# Altium schematic symbol library jlcpcb_2025_04_inductors_extended_0805.schlib: 882 symbols (part 2 of 5)
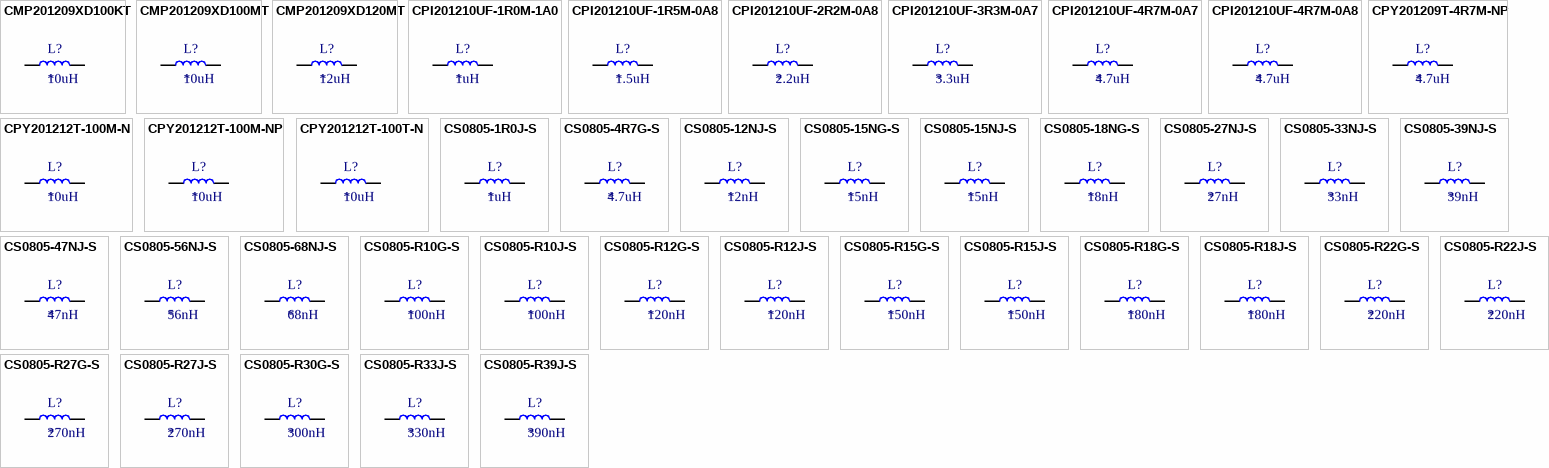
[diagram p23: symbols CMP201209XD100KT to CS0805-R39J-S]

## CS0805-R12G-S
designator L?  Inductance: 120nH
Inductor, 120nH, ±2%, 510mΩ, 400mA, SMD 0805; Manufacturer: Chilisin Elec; Manufacturer Part Number: CS0805-R12G-S; Self-Resonant Frequency: 250MHz; Q Factor: 50@150MHz; Package Size: 0805; JLCPCB Basic Part: No; JLCPCB Part Number: C320429; Supplier 1: LCSC; Category: Inductors; Supplier Part Number 1: C320429; Tolerance: ±2%; Rated Current: 400mA; DC Resistance: 510mΩ; RoHS: Yes; ComponentLink1Description: Datasheet; ComponentLink1URL: https://wmsc.lcsc.com/wmsc/upload/file/pdf/v2/lcsc/2304140030_Chilisin-Elec-CS0805-R12G-S_C320429.pdf; ComponentLink2Description: JLCPCB Part URL; ComponentLink2URL: https://jlcpcb.com/partdetail/C320429; ComponentLink3Description: LCSC Part URL; ComponentLink3URL: https://lcsc.com/product-detail/Inductors-SMD_Chilisin-Elec-Chilisin-Elec-CS0805-R12G-S_C320429.html
footprint IND-0805 (0805 (2012M) Inductor)
pins: 1, 2

## CS0805-R12J-S
designator L?  Inductance: 120nH
Inductor, 120nH, ±5%, 510mΩ, 400mA, SMD 0805; Manufacturer: Chilisin Elec; Manufacturer Part Number: CS0805-R12J-S; Self-Resonant Frequency: 250MHz; Q Factor: 50@150MHz; Package Size: 0805; JLCPCB Basic Part: No; JLCPCB Part Number: C108268; Supplier 1: LCSC; Category: Inductors; Supplier Part Number 1: C108268; Tolerance: ±5%; Rated Current: 400mA; DC Resistance: 510mΩ; RoHS: Yes; ComponentLink1Description: Datasheet; ComponentLink1URL: https://wmsc.lcsc.com/wmsc/upload/file/pdf/v2/lcsc/2304140030_Chilisin-Elec-CS0805-R12J-S_C108268.pdf; ComponentLink2Description: JLCPCB Part URL; ComponentLink2URL: https://jlcpcb.com/partdetail/C108268; ComponentLink3Description: LCSC Part URL; ComponentLink3URL: https://lcsc.com/product-detail/Inductors-SMD_Chilisin-Elec-Chilisin-Elec-CS0805-R12J-S_C108268.html
footprint IND-0805 (0805 (2012M) Inductor)
pins: 1, 2

## CS0805-R15G-S
designator L?  Inductance: 150nH
Inductor, 150nH, ±2%, 560mΩ, 400mA, SMD 0805; Manufacturer: Chilisin Elec; Manufacturer Part Number: CS0805-R15G-S; Self-Resonant Frequency: 250MHz; Q Factor: 50@100MHz; Package Size: 0805; JLCPCB Basic Part: No; JLCPCB Part Number: C285947; Supplier 1: LCSC; Category: Inductors; Supplier Part Number 1: C285947; Tolerance: ±2%; Rated Current: 400mA; DC Resistance: 560mΩ; RoHS: Yes; ComponentLink1Description: Datasheet; ComponentLink1URL: https://wmsc.lcsc.com/wmsc/upload/file/pdf/v2/lcsc/2304140030_Chilisin-Elec-CS0805-R15G-S_C285947.pdf; ComponentLink2Description: JLCPCB Part URL; ComponentLink2URL: https://jlcpcb.com/partdetail/C285947; ComponentLink3Description: LCSC Part URL; ComponentLink3URL: https://lcsc.com/product-detail/Inductors-SMD_Chilisin-Elec-Chilisin-Elec-CS0805-R15G-S_C285947.html
footprint IND-0805 (0805 (2012M) Inductor)
pins: 1, 2

## CS0805-R15J-S
designator L?  Inductance: 150nH
Inductor, 150nH, ±5%, 560mΩ, 400mA, SMD 0805; Manufacturer: Chilisin Elec; Manufacturer Part Number: CS0805-R15J-S; Self-Resonant Frequency: 250MHz; Q Factor: 50@100MHz; Package Size: 0805; JLCPCB Basic Part: No; JLCPCB Part Number: C280464; Supplier 1: LCSC; Category: Inductors; Supplier Part Number 1: C280464; Tolerance: ±5%; Rated Current: 400mA; DC Resistance: 560mΩ; RoHS: Yes; ComponentLink1Description: Datasheet; ComponentLink1URL: https://wmsc.lcsc.com/wmsc/upload/file/pdf/v2/lcsc/2304140030_Chilisin-Elec-CS0805-R15J-S_C280464.pdf; ComponentLink2Description: JLCPCB Part URL; ComponentLink2URL: https://jlcpcb.com/partdetail/C280464; ComponentLink3Description: LCSC Part URL; ComponentLink3URL: https://lcsc.com/product-detail/Inductors-SMD_Chilisin-Elec-Chilisin-Elec-CS0805-R15J-S_C280464.html
footprint IND-0805 (0805 (2012M) Inductor)
pins: 1, 2

## CS0805-R18G-S
designator L?  Inductance: 180nH
Inductor, 180nH, ±2%, 640mΩ, 400mA, SMD 0805; Manufacturer: Chilisin Elec; Manufacturer Part Number: CS0805-R18G-S; Self-Resonant Frequency: 250MHz; Q Factor: 50@100MHz; Package Size: 0805; JLCPCB Basic Part: No; JLCPCB Part Number: C285946; Supplier 1: LCSC; Category: Inductors; Supplier Part Number 1: C285946; Tolerance: ±2%; Rated Current: 400mA; DC Resistance: 640mΩ; RoHS: Yes; ComponentLink1Description: Datasheet; ComponentLink1URL: https://wmsc.lcsc.com/wmsc/upload/file/pdf/v2/lcsc/1912111437_Chilisin-Elec-CS0805-R18G-S_C285946.pdf; ComponentLink2Description: JLCPCB Part URL; ComponentLink2URL: https://jlcpcb.com/partdetail/C285946; ComponentLink3Description: LCSC Part URL; ComponentLink3URL: https://lcsc.com/product-detail/Inductors-SMD_Chilisin-Elec-Chilisin-Elec-CS0805-R18G-S_C285946.html
footprint IND-0805 (0805 (2012M) Inductor)
pins: 1, 2

## CS0805-R18J-S
designator L?  Inductance: 180nH
Inductor, 180nH, ±5%, 640mΩ, 400mA, SMD 0805; Manufacturer: Chilisin Elec; Manufacturer Part Number: CS0805-R18J-S; Self-Resonant Frequency: 250MHz; Q Factor: 50@100MHz; Package Size: 0805; JLCPCB Basic Part: No; JLCPCB Part Number: C108269; Supplier 1: LCSC; Category: Inductors; Supplier Part Number 1: C108269; Tolerance: ±5%; Rated Current: 400mA; DC Resistance: 640mΩ; RoHS: Yes; ComponentLink1Description: Datasheet; ComponentLink1URL: https://wmsc.lcsc.com/wmsc/upload/file/pdf/v2/lcsc/2304140030_Chilisin-Elec-CS0805-R18J-S_C108269.pdf; ComponentLink2Description: JLCPCB Part URL; ComponentLink2URL: https://jlcpcb.com/partdetail/C108269; ComponentLink3Description: LCSC Part URL; ComponentLink3URL: https://lcsc.com/product-detail/Inductors-SMD_Chilisin-Elec-Chilisin-Elec-CS0805-R18J-S_C108269.html
footprint IND-0805 (0805 (2012M) Inductor)
pins: 1, 2

## CS0805-R22G-S
designator L?  Inductance: 220nH
Inductor, 220nH, ±2%, 70mΩ, 400mA, SMD 0805; Manufacturer: Chilisin Elec; Manufacturer Part Number: CS0805-R22G-S; Self-Resonant Frequency: 100MHz; Q Factor: 50@100MHz; Package Size: 0805; JLCPCB Basic Part: No; JLCPCB Part Number: C2847108; Supplier 1: LCSC; Category: Inductors; Supplier Part Number 1: C2847108; Tolerance: ±2%; Rated Current: 400mA; DC Resistance: 70mΩ; RoHS: Yes; ComponentLink1Description: Datasheet; ComponentLink1URL: https://wmsc.lcsc.com/wmsc/upload/file/pdf/v2/lcsc/2108142130_Chilisin-Elec-CS0805-R22G-S_C2847108.pdf; ComponentLink2Description: JLCPCB Part URL; ComponentLink2URL: https://jlcpcb.com/partdetail/C2847108; ComponentLink3Description: LCSC Part URL; ComponentLink3URL: https://lcsc.com/product-detail/Inductors-SMD_Chilisin-Elec-Chilisin-Elec-CS0805-R22G-S_C2847108.html
footprint IND-0805 (0805 (2012M) Inductor)
pins: 1, 2

## CS0805-R22J-S
designator L?  Inductance: 220nH
Inductor, 220nH, ±5%, 700mΩ, 400mA, SMD 0805; Manufacturer: Chilisin Elec; Manufacturer Part Number: CS0805-R22J-S; Self-Resonant Frequency: 250MHz; Q Factor: 50@100MHz; Package Size: 0805; JLCPCB Basic Part: No; JLCPCB Part Number: C108270; Supplier 1: LCSC; Category: Inductors; Supplier Part Number 1: C108270; Tolerance: ±5%; Rated Current: 400mA; DC Resistance: 700mΩ; RoHS: Yes; ComponentLink1Description: Datasheet; ComponentLink1URL: https://wmsc.lcsc.com/wmsc/upload/file/pdf/v2/lcsc/2304140030_Chilisin-Elec-CS0805-R22J-S_C108270.pdf; ComponentLink2Description: JLCPCB Part URL; ComponentLink2URL: https://jlcpcb.com/partdetail/C108270; ComponentLink3Description: LCSC Part URL; ComponentLink3URL: https://lcsc.com/product-detail/Inductors-SMD_Chilisin-Elec-Chilisin-Elec-CS0805-R22J-S_C108270.html
footprint IND-0805 (0805 (2012M) Inductor)
pins: 1, 2

## CS0805-R27G-S
designator L?  Inductance: 270nH
Inductor, 270nH, ±2%, 1Ω, 350mA, SMD 0805; Manufacturer: Chilisin Elec; Manufacturer Part Number: CS0805-R27G-S; Self-Resonant Frequency: 250MHz; Q Factor: 48@100MHz; Package Size: 0805; JLCPCB Basic Part: No; JLCPCB Part Number: C285945; Supplier 1: LCSC; Category: Inductors; Supplier Part Number 1: C285945; Tolerance: ±2%; Rated Current: 350mA; DC Resistance: 1Ω; RoHS: Yes; ComponentLink1Description: Datasheet; ComponentLink1URL: https://wmsc.lcsc.com/wmsc/upload/file/pdf/v2/lcsc/2304140030_Chilisin-Elec-CS0805-R27G-S_C285945.pdf; ComponentLink2Description: JLCPCB Part URL; ComponentLink2URL: https://jlcpcb.com/partdetail/C285945; ComponentLink3Description: LCSC Part URL; ComponentLink3URL: https://lcsc.com/product-detail/Inductors-SMD_Chilisin-Elec-Chilisin-Elec-CS0805-R27G-S_C285945.html
footprint IND-0805 (0805 (2012M) Inductor)
pins: 1, 2

## CS0805-R27J-S
designator L?  Inductance: 270nH
Inductor, 270nH, ±5%, 1Ω, 350mA, SMD 0805; Manufacturer: Chilisin Elec; Manufacturer Part Number: CS0805-R27J-S; Self-Resonant Frequency: 250MHz; Q Factor: 48@100MHz; Package Size: 0805; JLCPCB Basic Part: No; JLCPCB Part Number: C108271; Supplier 1: LCSC; Category: Inductors; Supplier Part Number 1: C108271; Tolerance: ±5%; Rated Current: 350mA; DC Resistance: 1Ω; RoHS: Yes; ComponentLink1Description: Datasheet; ComponentLink1URL: https://wmsc.lcsc.com/wmsc/upload/file/pdf/v2/lcsc/2304140030_Chilisin-Elec-CS0805-R27J-S_C108271.pdf; ComponentLink2Description: JLCPCB Part URL; ComponentLink2URL: https://jlcpcb.com/partdetail/C108271; ComponentLink3Description: LCSC Part URL; ComponentLink3URL: https://lcsc.com/product-detail/Inductors-SMD_Chilisin-Elec-Chilisin-Elec-CS0805-R27J-S_C108271.html
footprint IND-0805 (0805 (2012M) Inductor)
pins: 1, 2

## CS0805-R30G-S
designator L?  Inductance: 300nH
Inductor, 300nH, ±2%, 1.4Ω, 310mA, SMD 0805; Manufacturer: Chilisin Elec; Manufacturer Part Number: CS0805-R30G-S; Self-Resonant Frequency: 250MHz; Q Factor: 25@100MHz; Package Size: 0805; JLCPCB Basic Part: No; JLCPCB Part Number: C320430; Supplier 1: LCSC; Category: Inductors; Supplier Part Number 1: C320430; Tolerance: ±2%; Rated Current: 310mA; DC Resistance: 1.4Ω; RoHS: Yes; ComponentLink1Description: Datasheet; ComponentLink1URL: https://wmsc.lcsc.com/wmsc/upload/file/pdf/v2/lcsc/2304140030_Chilisin-Elec-CS0805-R30G-S_C320430.pdf; ComponentLink2Description: JLCPCB Part URL; ComponentLink2URL: https://jlcpcb.com/partdetail/C320430; ComponentLink3Description: LCSC Part URL; ComponentLink3URL: https://lcsc.com/product-detail/Inductors-SMD_Chilisin-Elec-Chilisin-Elec-CS0805-R30G-S_C320430.html
footprint IND-0805 (0805 (2012M) Inductor)
pins: 1, 2

## CS0805-R33J-S
designator L?  Inductance: 330nH
Inductor, 330nH, ±5%, 1.4Ω, 310mA, SMD 0805; Manufacturer: Chilisin Elec; Manufacturer Part Number: CS0805-R33J-S; Self-Resonant Frequency: 250MHz; Q Factor: 48@100MHz; Package Size: 0805; JLCPCB Basic Part: No; JLCPCB Part Number: C285944; Supplier 1: LCSC; Category: Inductors; Supplier Part Number 1: C285944; Tolerance: ±5%; Rated Current: 310mA; DC Resistance: 1.4Ω; RoHS: Yes; ComponentLink1Description: Datasheet; ComponentLink1URL: https://wmsc.lcsc.com/wmsc/upload/file/pdf/v2/lcsc/2304140030_Chilisin-Elec-CS0805-R33J-S_C285944.pdf; ComponentLink2Description: JLCPCB Part URL; ComponentLink2URL: https://jlcpcb.com/partdetail/C285944; ComponentLink3Description: LCSC Part URL; ComponentLink3URL: https://lcsc.com/product-detail/Inductors-SMD_Chilisin-Elec-Chilisin-Elec-CS0805-R33J-S_C285944.html
footprint IND-0805 (0805 (2012M) Inductor)
pins: 1, 2

## CS0805-R39J-S
designator L?  Inductance: 390nH
Inductor, 390nH, ±5%, 1.5Ω, 290mA, SMD 0805; Manufacturer: Chilisin Elec; Manufacturer Part Number: CS0805-R39J-S; Self-Resonant Frequency: 250MHz; Q Factor: 48@100MHz; Package Size: 0805; JLCPCB Basic Part: No; JLCPCB Part Number: C108272; Supplier 1: LCSC; Category: Inductors; Supplier Part Number 1: C108272; Tolerance: ±5%; Rated Current: 290mA; DC Resistance: 1.5Ω; RoHS: Yes; ComponentLink1Description: Datasheet; ComponentLink1URL: https://wmsc.lcsc.com/wmsc/upload/file/pdf/v2/lcsc/2304140030_Chilisin-Elec-CS0805-R39J-S_C108272.pdf; ComponentLink2Description: JLCPCB Part URL; ComponentLink2URL: https://jlcpcb.com/partdetail/C108272; ComponentLink3Description: LCSC Part URL; ComponentLink3URL: https://lcsc.com/product-detail/Inductors-SMD_Chilisin-Elec-Chilisin-Elec-CS0805-R39J-S_C108272.html
footprint IND-0805 (0805 (2012M) Inductor)
pins: 1, 2

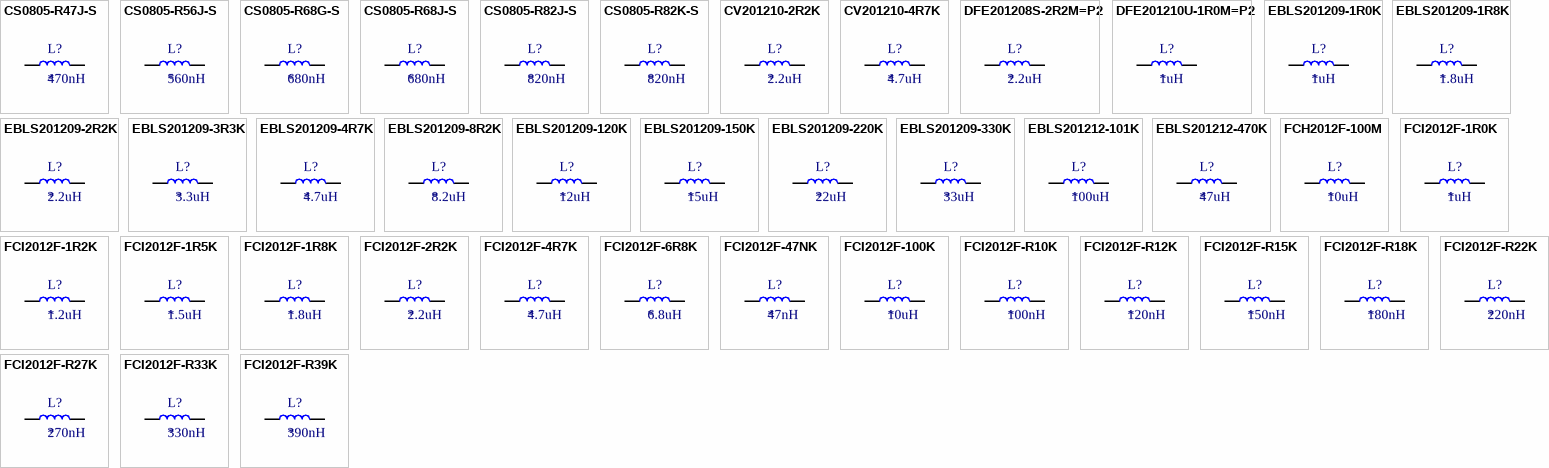
[diagram p5: symbols CS0805-R47J-S to FCI2012F-R39K]

## CS0805-R47J-S
designator L?  Inductance: 470nH
Inductor, 470nH, ±5%, 1.76Ω, 250mA, SMD 0805; Manufacturer: Chilisin Elec; Manufacturer Part Number: CS0805-R47J-S; Self-Resonant Frequency: 100MHz; Q Factor: 33@50MHz; Package Size: 0805; JLCPCB Basic Part: No; JLCPCB Part Number: C108273; Supplier 1: LCSC; Category: Inductors; Supplier Part Number 1: C108273; Tolerance: ±5%; Rated Current: 250mA; DC Resistance: 1.76Ω; RoHS: Yes; ComponentLink1Description: Datasheet; ComponentLink1URL: https://wmsc.lcsc.com/wmsc/upload/file/pdf/v2/lcsc/2304140030_Chilisin-Elec-CS0805-R47J-S_C108273.pdf; ComponentLink2Description: JLCPCB Part URL; ComponentLink2URL: https://jlcpcb.com/partdetail/C108273; ComponentLink3Description: LCSC Part URL; ComponentLink3URL: https://lcsc.com/product-detail/Inductors-SMD_Chilisin-Elec-Chilisin-Elec-CS0805-R47J-S_C108273.html
footprint IND-0805 (0805 (2012M) Inductor)
pins: 1, 2

## CS0805-R56J-S
designator L?  Inductance: 560nH
Inductor, 560nH, ±5%, 1.9Ω, 230mA, SMD 0805; Manufacturer: Chilisin Elec; Manufacturer Part Number: CS0805-R56J-S; Self-Resonant Frequency: 50MHz; Q Factor: 23@25MHz; Package Size: 0805; JLCPCB Basic Part: No; JLCPCB Part Number: C108274; Supplier 1: LCSC; Category: Inductors; Supplier Part Number 1: C108274; Tolerance: ±5%; Rated Current: 230mA; DC Resistance: 1.9Ω; RoHS: Yes; ComponentLink1Description: Datasheet; ComponentLink1URL: https://wmsc.lcsc.com/wmsc/upload/file/pdf/v2/lcsc/2304140030_Chilisin-Elec-CS0805-R56J-S_C108274.pdf; ComponentLink2Description: JLCPCB Part URL; ComponentLink2URL: https://jlcpcb.com/partdetail/C108274; ComponentLink3Description: LCSC Part URL; ComponentLink3URL: https://lcsc.com/product-detail/Inductors-SMD_Chilisin-Elec-Chilisin-Elec-CS0805-R56J-S_C108274.html
footprint IND-0805 (0805 (2012M) Inductor)
pins: 1, 2

## CS0805-R68G-S
designator L?  Inductance: 680nH
Inductor, 680nH, ±2%, 2.2Ω, 190mA, SMD 0805; Manufacturer: Chilisin Elec; Manufacturer Part Number: CS0805-R68G-S; Self-Resonant Frequency: 50MHz; Q Factor: 23@25MHz; Package Size: 0805; JLCPCB Basic Part: No; JLCPCB Part Number: C320431; Supplier 1: LCSC; Category: Inductors; Supplier Part Number 1: C320431; Tolerance: ±2%; Rated Current: 190mA; DC Resistance: 2.2Ω; RoHS: Yes; ComponentLink1Description: Datasheet; ComponentLink1URL: https://wmsc.lcsc.com/wmsc/upload/file/pdf/v2/lcsc/2304140030_Chilisin-Elec-CS0805-R68G-S_C320431.pdf; ComponentLink2Description: JLCPCB Part URL; ComponentLink2URL: https://jlcpcb.com/partdetail/C320431; ComponentLink3Description: LCSC Part URL; ComponentLink3URL: https://lcsc.com/product-detail/Inductors-SMD_Chilisin-Elec-Chilisin-Elec-CS0805-R68G-S_C320431.html
footprint IND-0805 (0805 (2012M) Inductor)
pins: 1, 2

## CS0805-R68J-S
designator L?  Inductance: 680nH
Inductor, 680nH, ±5%, 2.2Ω, 190mA, SMD 0805; Manufacturer: Chilisin Elec; Manufacturer Part Number: CS0805-R68J-S; Self-Resonant Frequency: 50MHz; Q Factor: 23@25MHz; Package Size: 0805; JLCPCB Basic Part: No; JLCPCB Part Number: C280466; Supplier 1: LCSC; Category: Inductors; Supplier Part Number 1: C280466; Tolerance: ±5%; Rated Current: 190mA; DC Resistance: 2.2Ω; RoHS: Yes; ComponentLink1Description: Datasheet; ComponentLink1URL: https://wmsc.lcsc.com/wmsc/upload/file/pdf/v2/lcsc/1810261322_Chilisin-Elec-CS0805-R68J-S_C280466.pdf; ComponentLink2Description: JLCPCB Part URL; ComponentLink2URL: https://jlcpcb.com/partdetail/C280466; ComponentLink3Description: LCSC Part URL; ComponentLink3URL: https://lcsc.com/product-detail/Inductors-SMD_Chilisin-Elec-Chilisin-Elec-CS0805-R68J-S_C280466.html
footprint IND-0805 (0805 (2012M) Inductor)
pins: 1, 2

## CS0805-R82J-S
designator L?  Inductance: 820nH
Inductor, 820nH, ±5%, 2.35Ω, 180mA, SMD 0805; Manufacturer: Chilisin Elec; Manufacturer Part Number: CS0805-R82J-S; Self-Resonant Frequency: 50MHz; Q Factor: 23@25MHz; Package Size: 0805; JLCPCB Basic Part: No; JLCPCB Part Number: C280467; Supplier 1: LCSC; Category: Inductors; Supplier Part Number 1: C280467; Tolerance: ±5%; Rated Current: 180mA; DC Resistance: 2.35Ω; RoHS: Yes; ComponentLink1Description: Datasheet; ComponentLink1URL: https://wmsc.lcsc.com/wmsc/upload/file/pdf/v2/lcsc/1810261322_Chilisin-Elec-CS0805-R82J-S_C280467.pdf; ComponentLink2Description: JLCPCB Part URL; ComponentLink2URL: https://jlcpcb.com/partdetail/C280467; ComponentLink3Description: LCSC Part URL; ComponentLink3URL: https://lcsc.com/product-detail/Inductors-SMD_Chilisin-Elec-Chilisin-Elec-CS0805-R82J-S_C280467.html
footprint IND-0805 (0805 (2012M) Inductor)
pins: 1, 2

## CS0805-R82K-S
designator L?  Inductance: 820nH
Inductor, 820nH, ±10%, 2.35Ω, 180mA, SMD 0805; Manufacturer: Chilisin Elec; Manufacturer Part Number: CS0805-R82K-S; Self-Resonant Frequency: 50MHz; Q Factor: 23@25MHz; Package Size: 0805; JLCPCB Basic Part: No; JLCPCB Part Number: C280468; Supplier 1: LCSC; Category: Inductors; Supplier Part Number 1: C280468; Tolerance: ±10%; Rated Current: 180mA; DC Resistance: 2.35Ω; RoHS: Yes; ComponentLink1Description: Datasheet; ComponentLink1URL: https://wmsc.lcsc.com/wmsc/upload/file/pdf/v2/lcsc/2304140030_Chilisin-Elec-CS0805-R82K-S_C280468.pdf; ComponentLink2Description: JLCPCB Part URL; ComponentLink2URL: https://jlcpcb.com/partdetail/C280468; ComponentLink3Description: LCSC Part URL; ComponentLink3URL: https://lcsc.com/product-detail/Inductors-SMD_Chilisin-Elec-Chilisin-Elec-CS0805-R82K-S_C280468.html
footprint IND-0805 (0805 (2012M) Inductor)
pins: 1, 2

## CV201210-2R2K
designator L?  Inductance: 2.2uH
Inductor, 2.2uH, ±10%, 650mΩ, 30mA, SMD 0805; Manufacturer: BOURNS; Manufacturer Part Number: CV201210-2R2K; Self-Resonant Frequency: 50MHz; Q Factor: 45@10MHz; Package Size: 0805; JLCPCB Basic Part: No; JLCPCB Part Number: C139455; Supplier 1: LCSC; Category: Inductors; Supplier Part Number 1: C139455; Tolerance: ±10%; Rated Current: 30mA; DC Resistance: 650mΩ; RoHS: Yes; ComponentLink1Description: Datasheet; ComponentLink1URL: https://wmsc.lcsc.com/wmsc/upload/file/pdf/v2/lcsc/2304140030_BOURNS-CV201210-2R2K_C139455.pdf; ComponentLink2Description: JLCPCB Part URL; ComponentLink2URL: https://jlcpcb.com/partdetail/C139455; ComponentLink3Description: LCSC Part URL; ComponentLink3URL: https://lcsc.com/product-detail/Inductors-SMD_BOURNS-BOURNS-CV201210-2R2K_C139455.html
footprint IND-0805 (0805 (2012M) Inductor)
pins: 1, 2

## CV201210-4R7K
designator L?  Inductance: 4.7uH
Inductor, 4.7uH, ±10%, 1Ω, 30mA, SMD 0805; Manufacturer: BOURNS; Manufacturer Part Number: CV201210-4R7K; Self-Resonant Frequency: 35MHz; Q Factor: 45@10MHz; Package Size: 0805; JLCPCB Basic Part: No; JLCPCB Part Number: C139457; Supplier 1: LCSC; Category: Inductors; Supplier Part Number 1: C139457; Tolerance: ±10%; Rated Current: 30mA; DC Resistance: 1Ω; RoHS: Yes; ComponentLink1Description: Datasheet; ComponentLink1URL: https://wmsc.lcsc.com/wmsc/upload/file/pdf/v2/lcsc/1804250532_BOURNS-CV201210-4R7K_C139457.pdf; ComponentLink2Description: JLCPCB Part URL; ComponentLink2URL: https://jlcpcb.com/partdetail/C139457; ComponentLink3Description: LCSC Part URL; ComponentLink3URL: https://lcsc.com/product-detail/Inductors-SMD_BOURNS-BOURNS-CV201210-4R7K_C139457.html
footprint IND-0805 (0805 (2012M) Inductor)
pins: 1, 2

## DFE201208S-2R2M=P2
designator L?  Inductance: 2.2uH
Inductor, 2.2uH, ±20%, 204mΩ, 1.4A, SMD 0805; Manufacturer: Murata Electronics; Manufacturer Part Number: DFE201208S-2R2M=P2; Package Size: 0805; JLCPCB Basic Part: No; JLCPCB Part Number: C2050346; Supplier 1: LCSC; Category: Inductors; Supplier Part Number 1: C2050346; Tolerance: ±20%; Rated Current: 1.4A; DC Resistance: 204mΩ; RoHS: Yes; ComponentLink1Description: Datasheet; ComponentLink1URL: https://wmsc.lcsc.com/wmsc/upload/file/pdf/v2/lcsc/2304140030_Murata-Electronics-DFE201208S-2R2M-P2_C2050346.pdf; ComponentLink2Description: JLCPCB Part URL; ComponentLink2URL: https://jlcpcb.com/partdetail/C2050346; ComponentLink3Description: LCSC Part URL; ComponentLink3URL: https://lcsc.com/product-detail/Inductors-SMD_Murata-Electronics-Murata-Electronics-DFE201208S-2R2M%3DP2_C2050346.html
footprint IND-0805 (0805 (2012M) Inductor)
pins: 1, 2

## DFE201210U-1R0M=P2
designator L?  Inductance: 1uH
Inductor, 1uH, ±20%, 95mΩ, 2A, SMD 0805; Manufacturer: Murata Electronics; Manufacturer Part Number: DFE201210U-1R0M=P2; Saturation Current: 3.1A; Package Size: 0805; JLCPCB Basic Part: No; JLCPCB Part Number: C1331798; Supplier 1: LCSC; Category: Inductors; Supplier Part Number 1: C1331798; Tolerance: ±20%; Rated Current: 2A; DC Resistance: 95mΩ; RoHS: Yes; ComponentLink1Description: Datasheet; ComponentLink1URL: https://wmsc.lcsc.com/wmsc/upload/file/pdf/v2/lcsc/2304140030_Murata-Electronics-DFE201210U-1R0M-P2_C1331798.pdf; ComponentLink2Description: JLCPCB Part URL; ComponentLink2URL: https://jlcpcb.com/partdetail/C1331798; ComponentLink3Description: LCSC Part URL; ComponentLink3URL: https://lcsc.com/product-detail/Inductors-SMD_Murata-Electronics-Murata-Electronics-DFE201210U-1R0M%3DP2_C1331798.html
footprint IND-0805 (0805 (2012M) Inductor)
pins: 1, 2

## EBLS201209-1R0K
designator L?  Inductance: 1uH
Inductor, 1uH, ±10%, 0.4Ω, 50mA, SMD 0805; Manufacturer: HYHONGYEX; Manufacturer Part Number: EBLS201209-1R0K; Self-Resonant Frequency: 75MHz; Q Factor: 45@10MHz; Package Size: 0805; JLCPCB Basic Part: No; JLCPCB Part Number: C963801; Supplier 1: LCSC; Category: Inductors; Supplier Part Number 1: C963801; Tolerance: ±10%; Rated Current: 50mA; DC Resistance: 0.4Ω; RoHS: Yes; ComponentLink1Description: Datasheet; ComponentLink1URL: https://wmsc.lcsc.com/wmsc/upload/file/pdf/v2/lcsc/2305190958_HYHONGYEX-EBLS201209-1R0K_C963801.pdf; ComponentLink2Description: JLCPCB Part URL; ComponentLink2URL: https://jlcpcb.com/partdetail/C963801; ComponentLink3Description: LCSC Part URL; ComponentLink3URL: https://lcsc.com/product-detail/Inductors-SMD_HYHONGYEX-HYHONGYEX-EBLS201209-1R0K_C963801.html
footprint IND-0805 (0805 (2012M) Inductor)
pins: 1, 2

## EBLS201209-1R8K
designator L?  Inductance: 1.8uH
Inductor, 1.8uH, ±10%, 0.6Ω, 50mA, SMD 0805; Manufacturer: HYHONGYEX; Manufacturer Part Number: EBLS201209-1R8K; Self-Resonant Frequency: 55MHz; Q Factor: 45@10MHz; Package Size: 0805; JLCPCB Basic Part: No; JLCPCB Part Number: C963802; Supplier 1: LCSC; Category: Inductors; Supplier Part Number 1: C963802; Tolerance: ±10%; Rated Current: 50mA; DC Resistance: 0.6Ω; RoHS: Yes; ComponentLink1Description: Datasheet; ComponentLink1URL: https://wmsc.lcsc.com/wmsc/upload/file/pdf/v2/lcsc/2305190958_HYHONGYEX-EBLS201209-1R8K_C963802.pdf; ComponentLink2Description: JLCPCB Part URL; ComponentLink2URL: https://jlcpcb.com/partdetail/C963802; ComponentLink3Description: LCSC Part URL; ComponentLink3URL: https://lcsc.com/product-detail/Inductors-SMD_HYHONGYEX-HYHONGYEX-EBLS201209-1R8K_C963802.html
footprint IND-0805 (0805 (2012M) Inductor)
pins: 1, 2

## EBLS201209-2R2K
designator L?  Inductance: 2.2uH
Inductor, 2.2uH, ±10%, 0.65Ω, 30mA, SMD 0805; Manufacturer: HYHONGYEX; Manufacturer Part Number: EBLS201209-2R2K; Self-Resonant Frequency: 50MHz; Q Factor: 45@10MHz; Package Size: 0805; JLCPCB Basic Part: No; JLCPCB Part Number: C963803; Supplier 1: LCSC; Category: Inductors; Supplier Part Number 1: C963803; Tolerance: ±10%; Rated Current: 30mA; DC Resistance: 0.65Ω; RoHS: Yes; ComponentLink1Description: Datasheet; ComponentLink1URL: https://wmsc.lcsc.com/wmsc/upload/file/pdf/v2/lcsc/2305190958_HYHONGYEX-EBLS201209-2R2K_C963803.pdf; ComponentLink2Description: JLCPCB Part URL; ComponentLink2URL: https://jlcpcb.com/partdetail/C963803; ComponentLink3Description: LCSC Part URL; ComponentLink3URL: https://lcsc.com/product-detail/Inductors-SMD_HYHONGYEX-HYHONGYEX-EBLS201209-2R2K_C963803.html
footprint IND-0805 (0805 (2012M) Inductor)
pins: 1, 2

## EBLS201209-3R3K
designator L?  Inductance: 3.3uH
Inductor, 3.3uH, ±10%, 0.8Ω, 30mA, SMD 0805; Manufacturer: HYHONGYEX; Manufacturer Part Number: EBLS201209-3R3K; Self-Resonant Frequency: 41MHz; Q Factor: 45@10MHz; Package Size: 0805; JLCPCB Basic Part: No; JLCPCB Part Number: C963804; Supplier 1: LCSC; Category: Inductors; Supplier Part Number 1: C963804; Tolerance: ±10%; Rated Current: 30mA; DC Resistance: 0.8Ω; RoHS: Yes; ComponentLink1Description: Datasheet; ComponentLink1URL: https://wmsc.lcsc.com/wmsc/upload/file/pdf/v2/lcsc/2305190958_HYHONGYEX-EBLS201209-3R3K_C963804.pdf; ComponentLink2Description: JLCPCB Part URL; ComponentLink2URL: https://jlcpcb.com/partdetail/C963804; ComponentLink3Description: LCSC Part URL; ComponentLink3URL: https://lcsc.com/product-detail/Inductors-SMD_HYHONGYEX-HYHONGYEX-EBLS201209-3R3K_C963804.html
footprint IND-0805 (0805 (2012M) Inductor)
pins: 1, 2

## EBLS201209-4R7K
designator L?  Inductance: 4.7uH
Inductor, 4.7uH, ±10%, 1Ω, 30mA, SMD 0805; Manufacturer: HYHONGYEX; Manufacturer Part Number: EBLS201209-4R7K; Self-Resonant Frequency: 35MHz; Q Factor: 45@10MHz; Package Size: 0805; JLCPCB Basic Part: No; JLCPCB Part Number: C963805; Supplier 1: LCSC; Category: Inductors; Supplier Part Number 1: C963805; Tolerance: ±10%; Rated Current: 30mA; DC Resistance: 1Ω; RoHS: Yes; ComponentLink1Description: Datasheet; ComponentLink1URL: https://wmsc.lcsc.com/wmsc/upload/file/pdf/v2/lcsc/2305190958_HYHONGYEX-EBLS201209-4R7K_C963805.pdf; ComponentLink2Description: JLCPCB Part URL; ComponentLink2URL: https://jlcpcb.com/partdetail/C963805; ComponentLink3Description: LCSC Part URL; ComponentLink3URL: https://lcsc.com/product-detail/Inductors-SMD_HYHONGYEX-HYHONGYEX-EBLS201209-4R7K_C963805.html
footprint IND-0805 (0805 (2012M) Inductor)
pins: 1, 2

## EBLS201209-8R2K
designator L?  Inductance: 8.2uH
Inductor, 8.2uH, ±10%, 1.1Ω, 15mA, SMD 0805; Manufacturer: HYHONGYEX; Manufacturer Part Number: EBLS201209-8R2K; Self-Resonant Frequency: 26MHz; Q Factor: 50@4MHz; Package Size: 0805; JLCPCB Basic Part: No; JLCPCB Part Number: C963808; Supplier 1: LCSC; Category: Inductors; Supplier Part Number 1: C963808; Tolerance: ±10%; Rated Current: 15mA; DC Resistance: 1.1Ω; RoHS: Yes; ComponentLink1Description: Datasheet; ComponentLink1URL: https://wmsc.lcsc.com/wmsc/upload/file/pdf/v2/lcsc/2305190959_HYHONGYEX-EBLS201209-8R2K_C963808.pdf; ComponentLink2Description: JLCPCB Part URL; ComponentLink2URL: https://jlcpcb.com/partdetail/C963808; ComponentLink3Description: LCSC Part URL; ComponentLink3URL: https://lcsc.com/product-detail/Inductors-SMD_HYHONGYEX-HYHONGYEX-EBLS201209-8R2K_C963808.html
footprint IND-0805 (0805 (2012M) Inductor)
pins: 1, 2

## EBLS201209-120K
designator L?  Inductance: 12uH
Inductor, 12uH, ±10%, 1.25Ω, 15mA, SMD 0805; Manufacturer: HYHONGYEX; Manufacturer Part Number: EBLS201209-120K; Self-Resonant Frequency: 22MHz; Q Factor: 50@2MHz; Package Size: 0805; JLCPCB Basic Part: No; JLCPCB Part Number: C963810; Supplier 1: LCSC; Category: Inductors; Supplier Part Number 1: C963810; Tolerance: ±10%; Rated Current: 15mA; DC Resistance: 1.25Ω; RoHS: Yes; ComponentLink1Description: Datasheet; ComponentLink1URL: https://wmsc.lcsc.com/wmsc/upload/file/pdf/v2/lcsc/2305190959_HYHONGYEX-EBLS201209-120K_C963810.pdf; ComponentLink2Description: JLCPCB Part URL; ComponentLink2URL: https://jlcpcb.com/partdetail/C963810; ComponentLink3Description: LCSC Part URL; ComponentLink3URL: https://lcsc.com/product-detail/Inductors-SMD_HYHONGYEX-HYHONGYEX-EBLS201209-120K_C963810.html
footprint IND-0805 (0805 (2012M) Inductor)
pins: 1, 2

## EBLS201209-150K
designator L?  Inductance: 15uH
Inductor, 15uH, ±10%, 0.8Ω, 5mA, SMD 0805; Manufacturer: HYHONGYEX; Manufacturer Part Number: EBLS201209-150K; Self-Resonant Frequency: 19MHz; Q Factor: 30@1MHz; Package Size: 0805; JLCPCB Basic Part: No; JLCPCB Part Number: C963811; Supplier 1: LCSC; Category: Inductors; Supplier Part Number 1: C963811; Tolerance: ±10%; Rated Current: 5mA; DC Resistance: 0.8Ω; RoHS: Yes; ComponentLink1Description: Datasheet; ComponentLink1URL: https://wmsc.lcsc.com/wmsc/upload/file/pdf/v2/lcsc/2305190959_HYHONGYEX-EBLS201209-150K_C963811.pdf; ComponentLink2Description: JLCPCB Part URL; ComponentLink2URL: https://jlcpcb.com/partdetail/C963811; ComponentLink3Description: LCSC Part URL; ComponentLink3URL: https://lcsc.com/product-detail/Inductors-SMD_HYHONGYEX-HYHONGYEX-EBLS201209-150K_C963811.html
footprint IND-0805 (0805 (2012M) Inductor)
pins: 1, 2

## EBLS201209-220K
designator L?  Inductance: 22uH
Inductor, 22uH, ±10%, 1.1Ω, 5mA, SMD 0805; Manufacturer: HYHONGYEX; Manufacturer Part Number: EBLS201209-220K; Self-Resonant Frequency: 16MHz; Q Factor: 30@1MHz; Package Size: 0805; JLCPCB Basic Part: No; JLCPCB Part Number: C963812; Supplier 1: LCSC; Category: Inductors; Supplier Part Number 1: C963812; Tolerance: ±10%; Rated Current: 5mA; DC Resistance: 1.1Ω; RoHS: Yes; ComponentLink1Description: Datasheet; ComponentLink1URL: https://wmsc.lcsc.com/wmsc/upload/file/pdf/v2/lcsc/2305190958_HYHONGYEX-EBLS201209-220K_C963812.pdf; ComponentLink2Description: JLCPCB Part URL; ComponentLink2URL: https://jlcpcb.com/partdetail/C963812; ComponentLink3Description: LCSC Part URL; ComponentLink3URL: https://lcsc.com/product-detail/Inductors-SMD_HYHONGYEX-HYHONGYEX-EBLS201209-220K_C963812.html
footprint IND-0805 (0805 (2012M) Inductor)
pins: 1, 2

## EBLS201209-330K
designator L?  Inductance: 33uH
Inductor, 33uH, ±10%, SMD 0805; Manufacturer: HYHONGYEX; Manufacturer Part Number: EBLS201209-330K; Package Size: 0805; JLCPCB Basic Part: No; JLCPCB Part Number: C963813; Supplier 1: LCSC; Category: Inductors; Supplier Part Number 1: C963813; Tolerance: ±10%; RoHS: Yes; ComponentLink1Description: Datasheet; ComponentLink1URL: https://wmsc.lcsc.com/wmsc/upload/file/pdf/v2/lcsc/2205060945_HYHONGYEX-EBLS201209-330K_C963813.pdf; ComponentLink2Description: JLCPCB Part URL; ComponentLink2URL: https://jlcpcb.com/partdetail/C963813; ComponentLink3Description: LCSC Part URL; ComponentLink3URL: https://lcsc.com/product-detail/Inductors-SMD_HYHONGYEX-HYHONGYEX-EBLS201209-330K_C963813.html
footprint IND-0805 (0805 (2012M) Inductor)
pins: 1, 2

## EBLS201212-101K
designator L?  Inductance: 100uH
Inductor, 100uH, ±10%, SMD 0805; Manufacturer: HYHONGYEX; Manufacturer Part Number: EBLS201212-101K; Package Size: 0805; JLCPCB Basic Part: No; JLCPCB Part Number: C963815; Supplier 1: LCSC; Category: Inductors; Supplier Part Number 1: C963815; Tolerance: ±10%; RoHS: Yes; ComponentLink1Description: Datasheet; ComponentLink1URL: https://wmsc.lcsc.com/wmsc/upload/file/pdf/v2/lcsc/2205060945_HYHONGYEX-EBLS201212-101K_C963815.pdf; ComponentLink2Description: JLCPCB Part URL; ComponentLink2URL: https://jlcpcb.com/partdetail/C963815; ComponentLink3Description: LCSC Part URL; ComponentLink3URL: https://lcsc.com/product-detail/Inductors-SMD_HYHONGYEX-HYHONGYEX-EBLS201212-101K_C963815.html
footprint IND-0805 (0805 (2012M) Inductor)
pins: 1, 2

## EBLS201212-470K
designator L?  Inductance: 47uH
Inductor, 47uH, ±10%, 3Ω, 4mA, SMD 0805; Manufacturer: HYHONGYEX; Manufacturer Part Number: EBLS201212-470K; Self-Resonant Frequency: 7.5MHz; Q Factor: 35@2MHz; Package Size: 0805; JLCPCB Basic Part: No; JLCPCB Part Number: C963814; Supplier 1: LCSC; Category: Inductors; Supplier Part Number 1: C963814; Tolerance: ±10%; Rated Current: 4mA; DC Resistance: 3Ω; RoHS: Yes; ComponentLink1Description: Datasheet; ComponentLink1URL: https://wmsc.lcsc.com/wmsc/upload/file/pdf/v2/lcsc/2305190958_HYHONGYEX-EBLS201212-470K_C963814.pdf; ComponentLink2Description: JLCPCB Part URL; ComponentLink2URL: https://jlcpcb.com/partdetail/C963814; ComponentLink3Description: LCSC Part URL; ComponentLink3URL: https://lcsc.com/product-detail/Inductors-SMD_HYHONGYEX-HYHONGYEX-EBLS201212-470K_C963814.html
footprint IND-0805 (0805 (2012M) Inductor)
pins: 1, 2

## FCH2012F-100M
designator L?  Inductance: 10uH
Inductor, 10uH, ±20%, 1.15Ω, 200mA, SMD 0805; Manufacturer: TAI-TECH; Manufacturer Part Number: FCH2012F-100M; Self-Resonant Frequency: 24MHz; Q Factor: 45@2MHz; Package Size: 0805; JLCPCB Basic Part: No; JLCPCB Part Number: C2932309; Supplier 1: LCSC; Category: Inductors; Supplier Part Number 1: C2932309; Tolerance: ±20%; Rated Current: 200mA; DC Resistance: 1.15Ω; RoHS: Yes; ComponentLink1Description: Datasheet; ComponentLink1URL: https://wmsc.lcsc.com/wmsc/upload/file/pdf/v2/lcsc/2201121530_TAI-TECH-FCH2012F-100M_C2932309.pdf; ComponentLink2Description: JLCPCB Part URL; ComponentLink2URL: https://jlcpcb.com/partdetail/C2932309; ComponentLink3Description: LCSC Part URL; ComponentLink3URL: https://lcsc.com/product-detail/Inductors-SMD_TAI-TECH-TAI-TECH-FCH2012F-100M_C2932309.html
footprint IND-0805 (0805 (2012M) Inductor)
pins: 1, 2

## FCI2012F-1R0K
designator L?  Inductance: 1uH
Inductor, 1uH, ±10%, 400mΩ, 50mA, SMD 0805; Manufacturer: TAI-TECH; Manufacturer Part Number: FCI2012F-1R0K; Package Size: 0805; JLCPCB Basic Part: No; JLCPCB Part Number: C127294; Supplier 1: LCSC; Category: Inductors; Supplier Part Number 1: C127294; Tolerance: ±10%; Rated Current: 50mA; DC Resistance: 400mΩ; RoHS: Yes; ComponentLink1Description: Datasheet; ComponentLink1URL: https://wmsc.lcsc.com/wmsc/upload/file/pdf/v2/lcsc/2009171134_TAI-TECH-FCI2012F-1R0K_C127294.pdf; ComponentLink2Description: JLCPCB Part URL; ComponentLink2URL: https://jlcpcb.com/partdetail/C127294; ComponentLink3Description: LCSC Part URL; ComponentLink3URL: https://lcsc.com/product-detail/Inductors-SMD_TAI-TECH-TAI-TECH-FCI2012F-1R0K_C127294.html
footprint IND-0805 (0805 (2012M) Inductor)
pins: 1, 2

## FCI2012F-1R2K
designator L?  Inductance: 1.2uH
Inductor, 1.2uH, SMD 0805; Manufacturer: TAI-TECH; Manufacturer Part Number: FCI2012F-1R2K; Package Size: 0805; JLCPCB Basic Part: No; JLCPCB Part Number: C356922; Supplier 1: LCSC; Category: Inductors; Supplier Part Number 1: C356922; RoHS: Yes; ComponentLink1Description: Datasheet; ComponentLink1URL: https://wmsc.lcsc.com/wmsc/upload/file/pdf/v2/lcsc/2009171137_TAI-TECH-FCI2012F-1R2K_C356922.pdf; ComponentLink2Description: JLCPCB Part URL; ComponentLink2URL: https://jlcpcb.com/partdetail/C356922; ComponentLink3Description: LCSC Part URL; ComponentLink3URL: https://lcsc.com/product-detail/Inductors-SMD_TAI-TECH-TAI-TECH-FCI2012F-1R2K_C356922.html
footprint IND-0805 (0805 (2012M) Inductor)
pins: 1, 2

## FCI2012F-1R5K
designator L?  Inductance: 1.5uH
Inductor, 1.5uH, ±10%, 500mΩ, 50mA, SMD 0805; Manufacturer: TAI-TECH; Manufacturer Part Number: FCI2012F-1R5K; Package Size: 0805; JLCPCB Basic Part: No; JLCPCB Part Number: C155019; Supplier 1: LCSC; Category: Inductors; Supplier Part Number 1: C155019; Tolerance: ±10%; Rated Current: 50mA; DC Resistance: 500mΩ; RoHS: Yes; ComponentLink1Description: Datasheet; ComponentLink1URL: https://wmsc.lcsc.com/wmsc/upload/file/pdf/v2/lcsc/2009171305_TAI-TECH-FCI2012F-1R5K_C155019.pdf; ComponentLink2Description: JLCPCB Part URL; ComponentLink2URL: https://jlcpcb.com/partdetail/C155019; ComponentLink3Description: LCSC Part URL; ComponentLink3URL: https://lcsc.com/product-detail/Inductors-SMD_TAI-TECH-TAI-TECH-FCI2012F-1R5K_C155019.html
footprint IND-0805 (0805 (2012M) Inductor)
pins: 1, 2

## FCI2012F-1R8K
designator L?  Inductance: 1.8uH
Inductor, 1.8uH, ±10%, 600mΩ, 50mA, SMD 0805; Manufacturer: TAI-TECH; Manufacturer Part Number: FCI2012F-1R8K; Package Size: 0805; JLCPCB Basic Part: No; JLCPCB Part Number: C155020; Supplier 1: LCSC; Category: Inductors; Supplier Part Number 1: C155020; Tolerance: ±10%; Rated Current: 50mA; DC Resistance: 600mΩ; RoHS: Yes; ComponentLink1Description: Datasheet; ComponentLink1URL: https://wmsc.lcsc.com/wmsc/upload/file/pdf/v2/lcsc/2009171305_TAI-TECH-FCI2012F-1R8K_C155020.pdf; ComponentLink2Description: JLCPCB Part URL; ComponentLink2URL: https://jlcpcb.com/partdetail/C155020; ComponentLink3Description: LCSC Part URL; ComponentLink3URL: https://lcsc.com/product-detail/Inductors-SMD_TAI-TECH-TAI-TECH-FCI2012F-1R8K_C155020.html
footprint IND-0805 (0805 (2012M) Inductor)
pins: 1, 2

## FCI2012F-2R2K
designator L?  Inductance: 2.2uH
Inductor, 2.2uH, ±10%, 650mΩ, 35mA, SMD 0805; Manufacturer: TAI-TECH; Manufacturer Part Number: FCI2012F-2R2K; Package Size: 0805; JLCPCB Basic Part: No; JLCPCB Part Number: C127289; Supplier 1: LCSC; Category: Inductors; Supplier Part Number 1: C127289; Tolerance: ±10%; Rated Current: 35mA; DC Resistance: 650mΩ; RoHS: Yes; ComponentLink1Description: Datasheet; ComponentLink1URL: https://wmsc.lcsc.com/wmsc/upload/file/pdf/v2/lcsc/2009171134_TAI-TECH-FCI2012F-2R2K_C127289.pdf; ComponentLink2Description: JLCPCB Part URL; ComponentLink2URL: https://jlcpcb.com/partdetail/C127289; ComponentLink3Description: LCSC Part URL; ComponentLink3URL: https://lcsc.com/product-detail/Inductors-SMD_TAI-TECH-TAI-TECH-FCI2012F-2R2K_C127289.html
footprint IND-0805 (0805 (2012M) Inductor)
pins: 1, 2

## FCI2012F-4R7K
designator L?  Inductance: 4.7uH
Inductor, 4.7uH, ±10%, 1Ω, 30mA, SMD 0805; Manufacturer: TAI-TECH; Manufacturer Part Number: FCI2012F-4R7K; Package Size: 0805; JLCPCB Basic Part: No; JLCPCB Part Number: C127296; Supplier 1: LCSC; Category: Inductors; Supplier Part Number 1: C127296; Tolerance: ±10%; Rated Current: 30mA; DC Resistance: 1Ω; RoHS: Yes; ComponentLink1Description: Datasheet; ComponentLink1URL: https://wmsc.lcsc.com/wmsc/upload/file/pdf/v2/lcsc/2009171134_TAI-TECH-FCI2012F-4R7K_C127296.pdf; ComponentLink2Description: JLCPCB Part URL; ComponentLink2URL: https://jlcpcb.com/partdetail/C127296; ComponentLink3Description: LCSC Part URL; ComponentLink3URL: https://lcsc.com/product-detail/Inductors-SMD_TAI-TECH-TAI-TECH-FCI2012F-4R7K_C127296.html
footprint IND-0805 (0805 (2012M) Inductor)
pins: 1, 2

## FCI2012F-6R8K
designator L?  Inductance: 6.8uH
Inductor, 6.8uH, SMD 0805; Manufacturer: TAI-TECH; Manufacturer Part Number: FCI2012F-6R8K; Package Size: 0805; JLCPCB Basic Part: No; JLCPCB Part Number: C356923; Supplier 1: LCSC; Category: Inductors; Supplier Part Number 1: C356923; RoHS: Yes; ComponentLink1Description: Datasheet; ComponentLink1URL: https://wmsc.lcsc.com/wmsc/upload/file/pdf/v2/lcsc/2009171137_TAI-TECH-FCI2012F-6R8K_C356923.pdf; ComponentLink2Description: JLCPCB Part URL; ComponentLink2URL: https://jlcpcb.com/partdetail/C356923; ComponentLink3Description: LCSC Part URL; ComponentLink3URL: https://lcsc.com/product-detail/Inductors-SMD_TAI-TECH-TAI-TECH-FCI2012F-6R8K_C356923.html
footprint IND-0805 (0805 (2012M) Inductor)
pins: 1, 2

## FCI2012F-47NK
designator L?  Inductance: 47nH
Inductor, 47nH, ±10%, 200mΩ, 300mA, SMD 0805; Manufacturer: TAI-TECH; Manufacturer Part Number: FCI2012F-47NK; Package Size: 0805; JLCPCB Basic Part: No; JLCPCB Part Number: C155023; Supplier 1: LCSC; Category: Inductors; Supplier Part Number 1: C155023; Tolerance: ±10%; Rated Current: 300mA; DC Resistance: 200mΩ; RoHS: Yes; ComponentLink1Description: Datasheet; ComponentLink1URL: https://wmsc.lcsc.com/wmsc/upload/file/pdf/v2/lcsc/2009171305_TAI-TECH-FCI2012F-47NK_C155023.pdf; ComponentLink2Description: JLCPCB Part URL; ComponentLink2URL: https://jlcpcb.com/partdetail/C155023; ComponentLink3Description: LCSC Part URL; ComponentLink3URL: https://lcsc.com/product-detail/Inductors-SMD_TAI-TECH-TAI-TECH-FCI2012F-47NK_C155023.html
footprint IND-0805 (0805 (2012M) Inductor)
pins: 1, 2

## FCI2012F-100K
designator L?  Inductance: 10uH
Inductor, 10uH, ±10%, 1.15Ω, 15mA, SMD 0805; Manufacturer: TAI-TECH; Manufacturer Part Number: FCI2012F-100K; Package Size: 0805; JLCPCB Basic Part: No; JLCPCB Part Number: C127283; Supplier 1: LCSC; Category: Inductors; Supplier Part Number 1: C127283; Tolerance: ±10%; Rated Current: 15mA; DC Resistance: 1.15Ω; RoHS: Yes; ComponentLink1Description: Datasheet; ComponentLink1URL: https://wmsc.lcsc.com/wmsc/upload/file/pdf/v2/lcsc/2009171134_TAI-TECH-FCI2012F-100K_C127283.pdf; ComponentLink2Description: JLCPCB Part URL; ComponentLink2URL: https://jlcpcb.com/partdetail/C127283; ComponentLink3Description: LCSC Part URL; ComponentLink3URL: https://lcsc.com/product-detail/Inductors-SMD_TAI-TECH-TAI-TECH-FCI2012F-100K_C127283.html
footprint IND-0805 (0805 (2012M) Inductor)
pins: 1, 2

## FCI2012F-R10K
designator L?  Inductance: 100nH
Inductor, 100nH, ±10%, 300mΩ, 250mA, SMD 0805; Manufacturer: TAI-TECH; Manufacturer Part Number: FCI2012F-R10K; Package Size: 0805; JLCPCB Basic Part: No; JLCPCB Part Number: C155024; Supplier 1: LCSC; Category: Inductors; Supplier Part Number 1: C155024; Tolerance: ±10%; Rated Current: 250mA; DC Resistance: 300mΩ; RoHS: Yes; ComponentLink1Description: Datasheet; ComponentLink1URL: https://wmsc.lcsc.com/wmsc/upload/file/pdf/v2/lcsc/2009171305_TAI-TECH-FCI2012F-R10K_C155024.pdf; ComponentLink2Description: JLCPCB Part URL; ComponentLink2URL: https://jlcpcb.com/partdetail/C155024; ComponentLink3Description: LCSC Part URL; ComponentLink3URL: https://lcsc.com/product-detail/Inductors-SMD_TAI-TECH-TAI-TECH-FCI2012F-R10K_C155024.html
footprint IND-0805 (0805 (2012M) Inductor)
pins: 1, 2
